# Altium footprint library En.PcbLib: 240 footprints (part 14 of 15)
Each footprint in its own frame and in the unit in brackets; x right, y up, seen from the top. Pads: shape width x height; smd on the part's side, far side on the other; paste and mask are expansions set on the pad; w line width, h text height; cw(c..) or ccw(c..) is an arc to the next point about the centre after c.
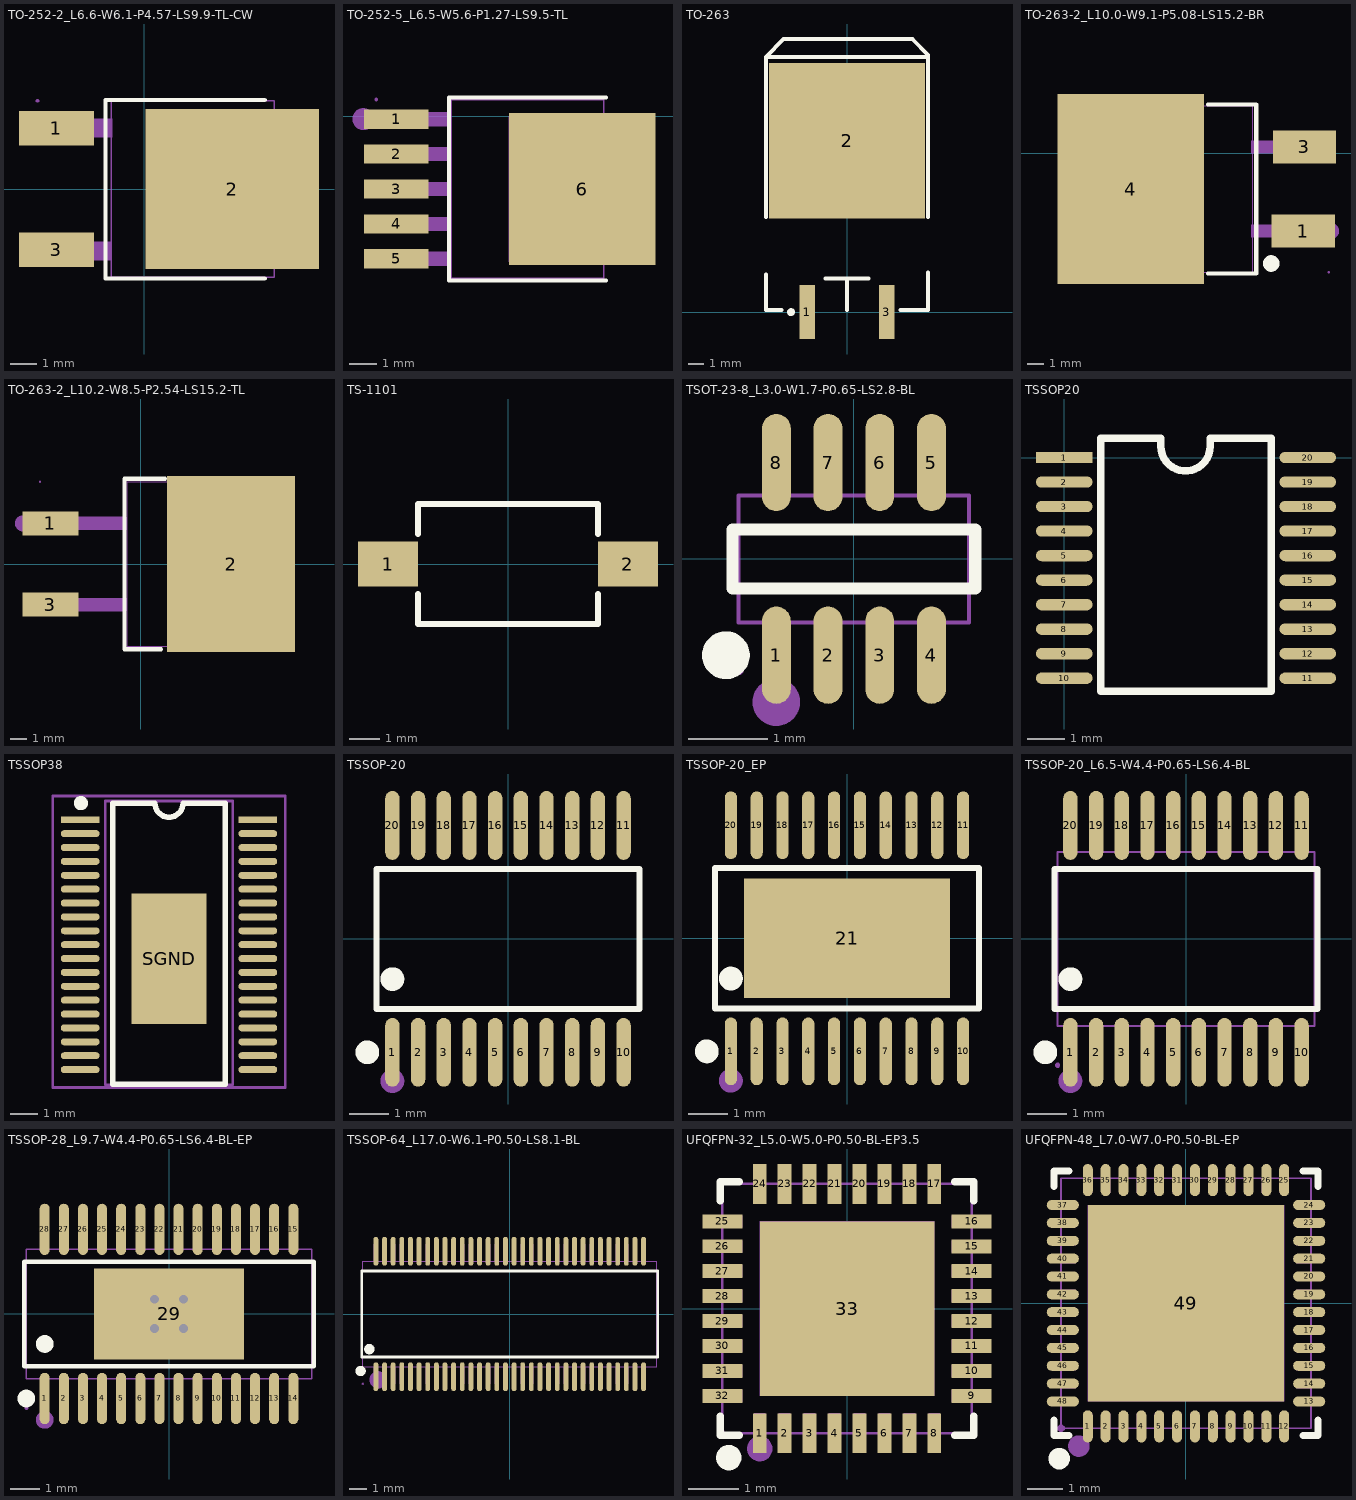
[diagram p13: the footprints below, top view; thin cyan lines are the x and y axes]

## TO-252-2_L6.6-W6.1-P4.57-LS9.9-TL-CW [mm]
pads (3):
  rect 2.8x1.3 smd: 1(-3.292,2.273) 3(-3.292,-2.273)
  rect 6.5x6 smd: 2(3.292,0)
Top Overlay:
  lines w0.152: 4.511,-3.353 -1.456,-3.353 -1.456,3.34 4.511,3.34
Mechanical 6:
  circle w0.6: c-3.962,2.286 r0.3
Mechanical 15:
  region: -3.938,3.3 -3.939,3.324 -3.974,3.358 -4.022,3.357 -4.057,3.324 -4.058,3.3 -4.057,3.276 -4.022,3.242 -3.974,3.242 -3.939,3.276
  region: 0.727,-2.667 0.727,2.668 5.403,2.668 5.937,2.135 5.937,-2.133 5.403,-2.667
  region: -3.998,-2.667 -3.998,-1.968 -2.408,-1.968 -2.408,-2.667
  region: -3.998,1.93 -3.998,2.629 -2.408,2.629 -2.408,1.93
  region: -2.474,-2.667 -2.474,-1.968 -1.224,-1.968 -1.224,-2.667
  region: -2.448,1.93 -2.448,2.629 -1.198,2.629 -1.198,1.93
  lines w0.051: -1.231,-3.3 -1.231,3.3 4.869,3.3 4.869,-3.3 -1.231,-3.3
3D body "User Library-TO252-2_TO252-25.sldprt": height 0.5, standoff 0, extent 1.267,-2.598 6.477,2.852
3D body "User Library-TO252-2_TO252-23.sldprt": height 1.57, standoff 0, extent -3.402,-2.705 -0.662,-1.905
3D body "User Library-TO252-2_TO252-23.sldprt": height 1.57, standoff 0, extent -3.402,1.905 -0.662,2.705
3D body "User Library-TO252-2_TO252-22.sldprt": height 1.57, standoff 1.07, extent -1.389,-0.4 -0.389,0.4
3D body "User Library-TO252-2_TO252-21.sldprt": height 2.29, standoff 0, extent -0.635,-3.302 5.465,3.278

## TO-252-5_L6.5-W5.6-P1.27-LS9.5-TL [mm]
pads (6):
  rect 2.357x0.7 smd: 1(28.19,-0.103) 2(28.19,-1.373) 3(28.19,-2.643) 4(28.19,-3.913) 5(28.19,-5.183)
  rect 5.324x5.512 smd: 6(34.948,-2.643)
Top Overlay:
  lines w0.152: 35.812,-5.969 30.109,-5.969 30.109,0.683 35.812,0.683
Mechanical 6:
  circle w0.4: c26.997,-0.103 r0.2
Mechanical 15:
  region: 27.521,0.607 27.521,0.632 27.486,0.667 27.436,0.667 27.401,0.632 27.401,0.607 27.401,0.582 27.436,0.547 27.486,0.547 27.521,0.582
  region: 27.461,-0.353 27.461,0.147 29.051,0.147 29.051,-0.353
  region: 29.041,-0.353 29.041,0.147 30.196,0.147 30.196,-0.353
  region: 27.461,-1.623 27.461,-1.123 29.051,-1.123 29.051,-1.623
  region: 29.041,-1.623 29.041,-1.123 30.196,-1.123 30.196,-1.623
  region: 27.461,-2.893 27.461,-2.393 29.051,-2.393 29.051,-2.893
  region: 29.041,-2.893 29.041,-2.393 30.196,-2.393 30.196,-2.893
  region: 27.461,-4.163 27.461,-3.663 29.051,-3.663 29.051,-4.163
  region: 29.041,-4.163 29.041,-3.663 30.196,-3.663 30.196,-4.163
  region: 27.461,-5.433 27.461,-4.933 29.051,-4.933 29.051,-5.433
  region: 29.041,-5.433 29.041,-4.933 30.196,-4.933 30.196,-5.433
  region: 32.286,-5.293 32.286,0.007 36.631,0.007 37.161,-0.523 37.161,-4.763 36.631,-5.293
  lines w0.051: 30.186,-5.893 30.186,0.607 35.736,0.607 35.736,-5.893 30.186,-5.893
3D body "User Library-DPAK-5-1.SLDPRT": height 2.4, standoff -0.01, extent 27.216,-5.89 38.082,0.81

## TO-263 [mm]
pads (3):
  rect 1x3.45 smd: 1(-2.54,0) 3(2.54,0)
  rect 10x10 smd: 2(0,11)
Top Overlay:
  circle w0.25: c-3.59,0 r0.125
  lines w0.254: -5.207,2.413 -5.207,0.127 -4.191,0.127 ; -5.207,6.096 -5.207,16.385 ; -1.397,2.159 1.397,2.159 ; 0,0.127 0,2.159 ; 3.429,0.127 5.207,0.127 5.207,2.54 ; 5.207,6.096 5.207,16.385 -5.207,16.385 ; 5.207,16.51 4.189,17.528 -4.064,17.528 -5.207,16.385
3D body "SW3dPS-DPAK.STEP": height 4.88, standoff -0.13, extent -5.08,-0.653 5.08,14.611

## TO-263-2_L10.0-W9.1-P5.08-LS15.2-BR [mm]
pads (3):
  rect 3.81x2 smd: 1(59.388,-4.699) 3(59.459,0.381)
  rect 8.84x11.43 smd: 4(48.997,-2.159)
Top Overlay:
  circle w0.5: c57.458,-6.649 r0.25
  lines w0.254: 53.648,-7.245 56.562,-7.245 56.562,2.927 53.648,2.927
Mechanical 6:
  circle w0.5: c61.048,-4.699 r0.25
Mechanical 15:
  region: 58.544,0.006 56.244,0.006 56.244,0.756 58.544,0.756
  region: 58.544,-5.074 56.244,-5.074 56.244,-4.324 58.544,-4.324
  region: 58.47,0.756 60.928,0.756 60.928,0.006 58.47,0.006
  region: 58.47,-4.324 60.928,-4.324 60.928,-5.074 58.47,-5.074
  region: 52.247,2.851 52.247,-7.169 46.749,-7.169 45.747,-6.167 45.747,1.849 46.749,2.851
  region: 60.988,-7.169 60.987,-7.145 60.952,-7.11 60.904,-7.11 60.869,-7.144 60.868,-7.169 60.869,-7.193 60.904,-7.227 60.952,-7.227 60.987,-7.193
  lines w0.051: 47.147,-7.169 47.147,2.851 56.342,2.851 56.342,-7.169 47.147,-7.169
3D body "SW3dPS-DPAK.STEP": height 4.88, standoff -0.13, extent 45.714,-7.112 60.978,3.048

## TO-263-2_L10.2-W8.5-P2.54-LS15.2-TL [mm]
pads (3):
  rect 3.5x1.5 smd: 1(-5.652,2.54) 3(-5.652,-2.54)
  rect 8x11 smd: 2(5.652,0)
Top Overlay:
  lines w0.254: 1.27,-5.334 -1.016,-5.334 -1.016,5.334 1.524,5.334
Mechanical 6:
  circle w0.5: c-7.366,2.54 r0.25
Mechanical 15:
  region: 1.9,5.05 8.2,5.05 8.9,4.35 8.9,-4.35 8.2,-5.05 1.9,-5.05
  region: -4.81,-2.945 -0.845,-2.945 -0.845,-2.135 -4.81,-2.135
  region: -6.3,-2.945 -4.8,-2.945 -4.8,-2.135 -6.3,-2.135
  region: -4.81,2.135 -0.845,2.135 -0.845,2.945 -4.81,2.945
  region: -6.3,2.135 -4.8,2.135 -4.8,2.945 -6.3,2.945
  region: -6.24,5.15 -6.24,5.174 -6.275,5.209 -6.324,5.209 -6.359,5.174 -6.36,5.15 -6.359,5.125 -6.324,5.091 -6.276,5.091 -6.241,5.125
  lines w0.051: -0.855,-5.15 -0.855,5.15 7.645,5.15 7.645,-5.15 -0.855,-5.15
3D body "wsk100p06.step": height 4.73, standoff -0.02, extent -6.42,-5.125 8.96,5.125

## TS-1101 [mm]
pads (2):
  rect 2x1.5 smd: 1(-4,0) 2(4,0)
Top Overlay:
  lines w0.2: -3,-1 -3,-2 3,-2 3,-1 ; -3,1 -3,2 3,2 3,1
3D body "TS-1101-X-X.stp": height 2.5, standoff 0, extent -4,-1.8 4,1.8

## TSOT-23-8_L3.0-W1.7-P0.65-LS2.8-BL [mm]
pads (8):
  oval 0.364x1.222 smd: 1(-0.975,-1.211) 2(-0.325,-1.211) 3(0.325,-1.211) 4(0.975,-1.211) 5(0.975,1.211) 6(0.325,1.211) 7(-0.325,1.211) 8(-0.975,1.211)
Top Overlay:
  circle w0.3: c-1.609,-1.211 r0.15
  lines w0.152: -1.526,-0.371 -1.526,0.371 1.526,0.371 1.526,-0.371 -1.526,-0.371
Mechanical 6:
  circle w0.3: c-0.975,-1.8 r0.15
Mechanical 15:
  region: -1.39,-1.4 -1.391,-1.376 -1.426,-1.341 -1.475,-1.341 -1.51,-1.376 -1.51,-1.4 -1.51,-1.425 -1.475,-1.459 -1.426,-1.459 -1.391,-1.425
  region: -1.12,-1.4 -1.12,-1 -0.83,-1 -0.83,-1.4
  region: -1.12,-1.01 -1.12,-0.79 -0.83,-0.79 -0.83,-1.01
  region: -0.47,-1.4 -0.47,-1 -0.18,-1 -0.18,-1.4
  region: -0.47,-1.01 -0.47,-0.79 -0.18,-0.79 -0.18,-1.01
  region: 0.18,-1.4 0.18,-1 0.47,-1 0.47,-1.4
  region: 0.18,-1.01 0.18,-0.79 0.47,-0.79 0.47,-1.01
  region: 0.83,-1.4 0.83,-1 1.12,-1 1.12,-1.4
  region: 0.83,-1.01 0.83,-0.79 1.12,-0.79 1.12,-1.01
  region: -1.12,1.4 -1.12,1 -0.83,1 -0.83,1.4
  region: -1.12,1.01 -1.12,0.79 -0.83,0.79 -0.83,1.01
  region: -0.47,1.4 -0.47,1 -0.18,1 -0.18,1.4
  region: -0.47,1.01 -0.47,0.79 -0.18,0.79 -0.18,1.01
  region: 0.18,1.4 0.18,1 0.47,1 0.47,1.4
  region: 0.18,1.01 0.18,0.79 0.47,0.79 0.47,1.01
  region: 0.83,1.4 0.83,1 1.12,1 1.12,1.4
  region: 0.83,1.01 0.83,0.79 1.12,0.79 1.12,1.01
  lines w0.051: -1.45,-0.8 -1.45,0.8 1.45,0.8 1.45,-0.8 -1.45,-0.8
3D body "TSOT23-8_MP3416_MNP.step": height 0.99, standoff 0, extent -1.499,-1.547 1.499,1.547

## TSSOP20 [mm]
pads (20):
  rect 1.5x0.3 smd: 1(0,0)
  oval 1.5x0.3 smd: 2(0,-0.65) 3(0,-1.3) 4(0,-1.95) 5(0,-2.6) 6(0,-3.25) 7(0,-3.9) 8(0,-4.55) 9(0,-5.2) 10(0,-5.85) 11(6.454,-5.85) 12(6.454,-5.2) 13(6.454,-4.55) 14(6.454,-3.9) 15(6.454,-3.25) 16(6.454,-2.6) 17(6.454,-1.95) 18(6.454,-1.3) 19(6.454,-0.65) 20(6.454,0)
Top Overlay:
  lines w0.2: 0.965,-6.2 5.486,-6.2 5.486,0.508 3.87,0.508 3.87,0.3 cw(c3.214,0.3) 2.559,0.3 2.559,0.508 0.965,0.508 0.965,-6.2
3D body "TSSOP-20.STEP": height 1.2, standoff 0, extent -0.049,-6.221 6.501,0.379

## TSSOP38 [mm]
pads (39):
  oval 1.4x0.25 smd: BG1(8.23,-18.986) BG2(8.23,-19.486) BST1(8.23,-17.486) BST2(14.63,-18.486) C/10(8.23,-11.986) CCM(14.63,-13.486) CLKOUT(14.63,-12.986) EN(8.23,-14.486) FB(14.63,-10.986) INTVcc(8.23,-16.486) ISMON(8.23,-13.486) ISN(14.63,-16.486) ISP(14.63,-16.986) IVINMON(8.23,-13.986) IVINN(8.23,-15.486) IVINP(8.23,-14.986) NC(14.63,-17.986) PGND(8.23,-18.486) PGND(14.63,-19.486) PWM(8.23,-11.486) PWMOUT(14.63,-13.986) RT(14.63,-11.986) SGND(14.63,-14.986) SGND(14.63,-14.486) SHORT(8.23,-12.486) SNSN(14.63,-15.486) SNSP(14.63,-15.986) SS(8.23,-10.986) SW1(8.23,-17.986) SW2(14.63,-18.986) SYNC(14.63,-12.486) TG1(8.23,-16.986) TG2(14.63,-17.486) Vc(14.63,-11.486) VIN(8.23,-15.986) Vref(8.23,-12.986)
  rect 1.4x0.25 smd: CTRL(8.23,-10.486) OVLO(14.63,-10.486)
  rect 2.7x4.7 smd: SGND(11.43,-15.494)
Top Overlay:
  circle w0.254: c8.255,-9.885 r0.13
  lines w0.2: 9.398,-20.011 10.414,-20.011 12.446,-20.011 13.462,-20.011 ; 9.398,-19.961 9.398,-9.885 10.922,-9.885 ccw(c11.43,-9.885) 11.938,-9.885 13.462,-9.885 13.462,-19.961
Top Solder:
  lines w0.251: 10.13,-14.986 11.43,-14.986 ; 11.43,-17.336 11.43,-14.986 ; 12.73,-14.986 11.43,-14.986
Mechanical 13:
  lines w0.1: 9.13,-20.036 13.73,-20.036 13.73,-9.811 9.13,-9.811 9.13,-20.036
Mechanical 15:
  circle w0.05: c11.43,-14.711 r0.35
  lines w0.05: 10.93,-14.711 11.93,-14.711 ; 11.43,-15.211 11.43,-14.211
  lines w0.1: 7.239,-20.136 15.621,-20.136 15.621,-9.631 7.239,-9.631 7.239,-20.136
3D body "User Library-TSSOP-38_Extruded2.sldprt": height 0.62, standoff -0.01, extent 8.086,-19.63 9.186,-19.38
3D body "User Library-TSSOP-38_Extruded2.sldprt": height 0.62, standoff -0.01, extent 8.086,-18.628 9.186,-18.378
3D body "User Library-TSSOP-38_Extruded2.sldprt": height 0.62, standoff -0.01, extent 8.086,-19.129 9.186,-18.879
3D body "User Library-TSSOP-38_Extruded2.sldprt": height 0.62, standoff -0.01, extent 8.086,-18.127 9.186,-17.877
3D body "User Library-TSSOP-38_Extruded2.sldprt": height 0.62, standoff -0.01, extent 8.086,-17.626 9.186,-17.376
3D body "User Library-TSSOP-38_Extruded2.sldprt": height 0.62, standoff -0.01, extent 8.086,-17.125 9.186,-16.875
3D body "User Library-TSSOP-38_Extruded2.sldprt": height 0.62, standoff -0.01, extent 8.086,-16.625 9.186,-16.375
3D body "User Library-TSSOP-38_Extruded2.sldprt": height 0.62, standoff -0.01, extent 8.086,-16.124 9.186,-15.874
3D body "User Library-TSSOP-38_Extruded2.sldprt": height 0.62, standoff -0.01, extent 8.086,-15.623 9.186,-15.373
3D body "User Library-TSSOP-38_Extruded2.sldprt": height 0.62, standoff -0.01, extent 8.086,-15.122 9.186,-14.872
3D body "User Library-TSSOP-38_Extruded2.sldprt": height 0.62, standoff -0.01, extent 8.086,-14.621 9.186,-14.371
3D body "User Library-TSSOP-38_Extruded2.sldprt": height 0.62, standoff -0.01, extent 8.086,-14.12 9.186,-13.87
3D body "User Library-TSSOP-38_Extruded2.sldprt": height 0.62, standoff -0.01, extent 8.086,-13.619 9.186,-13.369
3D body "User Library-TSSOP-38_Extruded2.sldprt": height 0.62, standoff -0.01, extent 8.086,-12.617 9.186,-12.367
3D body "User Library-TSSOP-38_Extruded2.sldprt": height 0.62, standoff -0.01, extent 8.086,-13.118 9.186,-12.868
3D body "User Library-TSSOP-38_Extruded2.sldprt": height 0.62, standoff -0.01, extent 8.086,-12.116 9.186,-11.866
3D body "User Library-TSSOP-38_Extruded2.sldprt": height 0.62, standoff -0.01, extent 8.086,-11.615 9.186,-11.365
3D body "User Library-TSSOP-38_Extruded2.sldprt": height 0.62, standoff -0.01, extent 8.086,-11.114 9.186,-10.864
3D body "User Library-TSSOP-38_Extruded2.sldprt": height 0.62, standoff -0.01, extent 8.086,-10.613 9.186,-10.363
3D body "User Library-TSSOP-38_Extruded2.sldprt": height 0.62, standoff -0.01, extent 13.674,-10.592 14.774,-10.342
3D body "User Library-TSSOP-38_Extruded2.sldprt": height 0.62, standoff -0.01, extent 13.674,-11.594 14.774,-11.344
3D body "User Library-TSSOP-38_Extruded2.sldprt": height 0.62, standoff -0.01, extent 13.674,-11.093 14.774,-10.843
3D body "User Library-TSSOP-38_Extruded2.sldprt": height 0.62, standoff -0.01, extent 13.674,-12.095 14.774,-11.845
3D body "User Library-TSSOP-38_Extruded2.sldprt": height 0.62, standoff -0.01, extent 13.674,-12.596 14.774,-12.346
3D body "User Library-TSSOP-38_Extruded2.sldprt": height 0.62, standoff -0.01, extent 13.674,-13.097 14.774,-12.847
3D body "User Library-TSSOP-38_Extruded2.sldprt": height 0.62, standoff -0.01, extent 13.674,-13.597 14.774,-13.347
3D body "User Library-TSSOP-38_Extruded2.sldprt": height 0.62, standoff -0.01, extent 13.674,-14.098 14.774,-13.848
3D body "User Library-TSSOP-38_Extruded2.sldprt": height 0.62, standoff -0.01, extent 13.674,-14.599 14.774,-14.349
3D body "User Library-TSSOP-38_Extruded2.sldprt": height 0.62, standoff -0.01, extent 13.674,-15.1 14.774,-14.85
3D body "User Library-TSSOP-38_Extruded2.sldprt": height 0.62, standoff -0.01, extent 13.674,-15.601 14.774,-15.351
3D body "User Library-TSSOP-38_Extruded2.sldprt": height 0.62, standoff -0.01, extent 13.674,-16.102 14.774,-15.852
3D body "User Library-TSSOP-38_Extruded2.sldprt": height 0.62, standoff -0.01, extent 13.674,-16.603 14.774,-16.353
3D body "User Library-TSSOP-38_Extruded2.sldprt": height 0.62, standoff -0.01, extent 13.674,-17.605 14.774,-17.355
3D body "User Library-TSSOP-38_Extruded2.sldprt": height 0.62, standoff -0.01, extent 13.674,-17.104 14.774,-16.854
3D body "User Library-TSSOP-38_Extruded2.sldprt": height 0.62, standoff -0.01, extent 13.674,-18.106 14.774,-17.856
3D body "User Library-TSSOP-38_Extruded2.sldprt": height 0.62, standoff -0.01, extent 13.674,-18.607 14.774,-18.357
3D body "User Library-TSSOP-38_Extruded2.sldprt": height 0.62, standoff -0.01, extent 13.674,-19.108 14.774,-18.858
3D body "User Library-TSSOP-38_Extruded2.sldprt": height 0.62, standoff -0.01, extent 13.674,-19.609 14.774,-19.359
3D body "User Library-TSSOP-38_Extruded3.sldprt": height 1.03, standoff 0.08, extent 9.18,-19.963 13.68,-10.263
3D body "User Library-TSSOP-38_Board3.sldprt": height 0.11, standoff 0, extent 5.588,-16.647 5.598,-16.637
3D body "User Library-TSSOP-38_Board3.sldprt": height 0.11, standoff 0, extent 3.556,-12.329 3.566,-12.319
3D body "User Library-TSSOP-38_Board2.sldprt": height 0.42, standoff 0, extent 20.701,-18.289 20.702,-18.288
3D body "User Library-TSSOP-38_Board2.sldprt": height 0.42, standoff 0, extent 20.066,-14.225 20.067,-14.224
3D body "User Library-TSSOP-38_Board2.sldprt": height 0.42, standoff 0, extent 11.43,-11.812 11.431,-11.811
3D body "User Library-TSSOP-38_Board2.sldprt": height 0.42, standoff 0, extent 17.018,-20.321 17.019,-20.32
3D body "User Library-TSSOP-38_Board2.sldprt": height 0.42, standoff 0, extent 11.684,-14.86 11.685,-14.859

## TSSOP-20 [mm]
pads (20):
  oval 0.364x1.742 smd: 1(-2.925,-2.871) 2(-2.275,-2.871) 3(-1.625,-2.871) 4(-0.975,-2.871) 5(-0.325,-2.871) 6(0.325,-2.871) 7(0.975,-2.871) 8(1.625,-2.871) 9(2.275,-2.871) 10(2.925,-2.871) 11(2.925,2.871) 12(2.275,2.871) 13(1.625,2.871) 14(0.975,2.871) 15(0.325,2.871) 16(-0.325,2.871) 17(-0.975,2.871) 18(-1.625,2.871) 19(-2.275,2.871) 20(-2.925,2.871)
Top Overlay:
  circle w0.3: c-2.925,-1.019 r0.15
  circle w0.3: c-3.559,-2.871 r0.15
  lines w0.152: -3.326,-1.771 -3.326,1.771 3.326,1.771 3.326,-1.771 -3.326,-1.771
Mechanical 15:
  circle w0.3: c-2.925,-3.6 r0.15
3D body "User Library-tssop-20-1.SLDPRT": height 1.2, standoff 0, extent -3.3,-3.3 3.3,3.3

## TSSOP-20_EP [mm]
pads (21):
  oval 0.308x1.706 smd: 1(-2.925,-2.848) 2(-2.275,-2.848) 3(-1.625,-2.848) 4(-0.975,-2.848) 5(-0.325,-2.848) 6(0.325,-2.848) 7(0.975,-2.848) 8(1.625,-2.848) 9(2.275,-2.848) 10(2.925,-2.848) 11(2.925,2.848) 12(2.275,2.848) 13(1.625,2.848) 14(0.975,2.848) 15(0.325,2.848) 16(-0.325,2.848) 17(-0.975,2.848) 18(-1.625,2.848) 19(-2.275,2.848) 20(-2.925,2.848)
  rect 5.2x3 smd: 21(0,0)
Top Overlay:
  circle w0.3: c-3.531,-2.848 r0.15
  circle w0.3: c-2.925,-1.014 r0.15
  lines w0.152: -3.326,-1.766 3.326,-1.766 3.326,1.766 -3.326,1.766 -3.326,-1.766
Mechanical 15:
  circle w0.3: c-2.925,-3.587 r0.15
3D body "User Library-tssop-20-1.SLDPRT": height 1.2, standoff 0, extent -3.3,-3.3 3.3,3.3

## TSSOP-20_L6.5-W4.4-P0.65-LS6.4-BL [mm]
pads (20):
  oval 0.364x1.742 smd: 1(-2.925,-2.871) 2(-2.275,-2.871) 3(-1.625,-2.871) 4(-0.975,-2.871) 5(-0.325,-2.871) 6(0.325,-2.871) 7(0.975,-2.871) 8(1.625,-2.871) 9(2.275,-2.871) 10(2.925,-2.871) 11(2.925,2.871) 12(2.275,2.871) 13(1.625,2.871) 14(0.975,2.871) 15(0.325,2.871) 16(-0.325,2.871) 17(-0.975,2.871) 18(-1.625,2.871) 19(-2.275,2.871) 20(-2.925,2.871)
Top Overlay:
  circle w0.3: c-2.925,-1.019 r0.15
  circle w0.3: c-3.559,-2.871 r0.15
  lines w0.152: -3.326,-1.771 -3.326,1.771 3.326,1.771 3.326,-1.771 -3.326,-1.771
Mechanical 6:
  circle w0.3: c-2.925,-3.6 r0.15
Mechanical 15:
  drawing of 45 lines, arcs and shapes, not listed
3D body "User Library-tssop-20-1.SLDPRT": height 1.2, standoff 0, extent -3.3,-3.3 3.3,3.3

## TSSOP-28_L9.7-W4.4-P0.65-LS6.4-BL-EP [mm]
pads (29):
  oval 0.343x1.747 smd: 1(-4.225,-2.873) 2(-3.575,-2.873) 3(-2.925,-2.873) 4(-2.275,-2.873) 5(-1.625,-2.873) 6(-0.975,-2.873) 7(-0.325,-2.873) 8(0.325,-2.873) 9(0.975,-2.873) 10(1.625,-2.873) 11(2.275,-2.873) 12(2.925,-2.873) 13(3.575,-2.873) 14(4.225,-2.873) 15(4.225,2.873) 16(3.575,2.873) 17(2.925,2.873) 18(2.275,2.873) 19(1.625,2.873) 20(0.975,2.873) 21(0.325,2.873) 22(-0.325,2.873) 23(-0.975,2.873) 24(-1.625,2.873) 25(-2.275,2.873) 26(-2.925,2.873) 27(-3.575,2.873) 28(-4.225,2.873)
  rect 5.1x3.1 smd: 29(0,0)
via 0.5,-0.5 diameter 0.61 hole 0.305
via -0.5,-0.5 diameter 0.61 hole 0.305
via -0.5,0.5 diameter 0.61 hole 0.305
via 0.5,0.5 diameter 0.61 hole 0.305
Top Overlay:
  circle w0.3: c-4.849,-2.873 r0.15
  circle w0.3: c-4.225,-1.019 r0.15
  lines w0.152: -4.926,-1.771 4.926,-1.771 4.926,1.771 -4.926,1.771 -4.926,-1.771
Mechanical 6:
  circle w0.3: c-4.225,-3.6 r0.15
Mechanical 15:
  drawing of 62 lines, arcs and shapes, not listed
3D body "User Library-tssop28.SLDPRT": height 1.2, standoff 0, extent -4.9,-3.2 4.9,3.2

## TSSOP-64_L17.0-W6.1-P0.50-LS8.1-BL [mm]
pads (64):
  oval 0.28x1.67 smd: 1(-7.75,-3.63) 2(-7.25,-3.63) 3(-6.75,-3.63) 4(-6.25,-3.63) 5(-5.75,-3.63) 6(-5.25,-3.63) 7(-4.75,-3.63) 8(-4.25,-3.63) 9(-3.75,-3.63) 10(-3.25,-3.63) 11(-2.75,-3.63) 12(-2.25,-3.63) 13(-1.75,-3.63) 14(-1.25,-3.63) 15(-0.75,-3.63) 16(-0.25,-3.63) 17(0.25,-3.63) 18(0.75,-3.63) 19(1.25,-3.63) 20(1.75,-3.63) 21(2.25,-3.63) 22(2.75,-3.63) 23(3.25,-3.63) 24(3.75,-3.63) 25(4.25,-3.63) 26(4.75,-3.63) 27(5.25,-3.63) 28(5.75,-3.63) 29(6.25,-3.63) 30(6.75,-3.63) 31(7.25,-3.63) 32(7.75,-3.63) 33(7.75,3.63) 34(7.25,3.63) 35(6.75,3.63) 36(6.25,3.63) 37(5.75,3.63) 38(5.25,3.63) 39(4.75,3.63) 40(4.25,3.63) 41(3.75,3.63) 42(3.25,3.63) 43(2.75,3.63) 44(2.25,3.63) 45(1.75,3.63) 46(1.25,3.63) 47(0.75,3.63) 48(0.25,3.63) 49(-0.25,3.63) 50(-0.75,3.63) 51(-1.25,3.63) 52(-1.75,3.63) 53(-2.25,3.63) 54(-2.75,3.63) 55(-3.25,3.63) 56(-3.75,3.63) 57(-4.25,3.63) 58(-4.75,3.63) 59(-5.25,3.63) 60(-5.75,3.63) 61(-6.25,3.63) 62(-6.75,3.63) 63(-7.25,3.63) 64(-7.75,3.63)
Top Overlay:
  circle w0.3: c-8.128,-2.032 r0.15
  circle w0.3: c-8.636,-3.302 r0.15
  lines w0.152: -8.576,-2.49 -8.576,2.49 8.576,2.49 8.576,-2.49 -8.576,-2.49
Mechanical 6:
  circle w0.5: c-7.62,-3.81 r0.25
Mechanical 15:
  drawing of 133 lines, arcs and shapes, not listed
3D body "sn75lvds387dggrg4.step": height 1.3, standoff 0.02, extent -8.5,-4.05 8.5,4.05

## UFQFPN-32_L5.0-W5.0-P0.50-BL-EP3.5 [mm]
pads (33):
  rect 0.28x0.8 smd paste-100 mask+0.051: 1(-1.75,-2.5) 2(-1.25,-2.5) 3(-0.75,-2.5) 4(-0.25,-2.5) 5(0.25,-2.5) 6(0.75,-2.5) 7(1.25,-2.5) 8(1.75,-2.5) 17(1.75,2.5) 18(1.25,2.5) 19(0.75,2.5) 20(0.25,2.5) 21(-0.25,2.5) 22(-0.75,2.5) 23(-1.25,2.5) 24(-1.75,2.5)
  rect 0.8x0.28 smd paste-100 mask+0.051: 9(2.5,-1.75) 10(2.5,-1.25) 11(2.5,-0.75) 12(2.5,-0.25) 13(2.5,0.25) 14(2.5,0.75) 15(2.5,1.25) 16(2.5,1.75) 25(-2.5,1.75) 26(-2.5,1.25) 27(-2.5,0.75) 28(-2.5,0.25) 29(-2.5,-0.25) 30(-2.5,-0.75) 31(-2.5,-1.25) 32(-2.5,-1.75)
  rect 3.5x3.5 smd paste-100 mask+0.051: 33(0,0)
Top Overlay:
  circle w0.254: c-2.37,-2.99 r0.127
  lines w0.152: -2.54,-2.159 -2.54,-2.54 -2.159,-2.54 ; -2.54,2.159 -2.54,2.54 -2.159,2.54 ; 2.159,-2.54 2.54,-2.54 2.54,-2.159 ; 2.159,2.54 2.54,2.54 2.54,2.159
Top Paste:
  drawing of 33 lines, arcs and shapes, not listed
Mechanical 6:
  circle w0.254: c-1.75,-2.81 r0.127
Mechanical 15:
  drawing of 38 lines, arcs and shapes, not listed
3D body "stm32g431kbu3.step": height 0.61, standoff 0, extent -2.51,-2.519 2.518,2.509

## UFQFPN-48_L7.0-W7.0-P0.50-BL-EP [mm]
pads (49):
  oval 0.28x0.9 smd: 1(-2.751,-3.449) 2(-2.25,-3.449) 3(-1.75,-3.449) 4(-1.25,-3.449) 5(-0.749,-3.449) 6(-0.249,-3.449) 7(0.249,-3.449) 8(0.749,-3.449) 9(1.25,-3.449) 10(1.75,-3.449) 11(2.251,-3.449) 12(2.751,-3.449) 25(2.751,3.449) 26(2.251,3.449) 27(1.75,3.449) 28(1.25,3.449) 29(0.749,3.449) 30(0.249,3.449) 31(-0.249,3.449) 32(-0.749,3.449) 33(-1.25,3.449) 34(-1.75,3.449) 35(-2.25,3.449) 36(-2.751,3.449)
  oval 0.9x0.28 smd: 13(3.449,-2.751) 14(3.449,-2.251) 15(3.449,-1.75) 16(3.449,-1.25) 17(3.449,-0.749) 18(3.449,-0.249) 19(3.449,0.249) 20(3.449,0.749) 21(3.449,1.25) 22(3.449,1.75) 23(3.449,2.25) 24(3.449,2.751) 37(-3.449,2.751) 38(-3.449,2.25) 39(-3.449,1.75) 40(-3.449,1.25) 41(-3.449,0.749) 42(-3.449,0.249) 43(-3.449,-0.249) 44(-3.449,-0.749) 45(-3.449,-1.25) 46(-3.449,-1.75) 47(-3.449,-2.251) 48(-3.449,-2.751)
  rect 5.5x5.5 smd: 49(0,0)
Top Overlay:
  lines w0.2: -3.7,-3.275 -3.7,-3.7 -3.275,-3.7 ; -3.7,3.275 -3.7,3.7 -3.275,3.7 ; 3.275,-3.7 3.7,-3.7 3.7,-3.275 ; 3.275,3.7 3.7,3.7 3.7,3.275
  lines w0.3: -3.551,-4.201 ccw(c-3.55,-4.351) -3.55,-4.501 ccw(c-3.55,-4.351) -3.548,-4.201
Mechanical 6:
  circle w0.3: c-3,-4 r0.15
Mechanical 15:
  drawing of 54 lines, arcs and shapes, not listed
3D body "stm32g431cbu6.step": height 0.61, standoff 0, extent -3.512,-3.51 3.515,3.517